# Altium footprint library THU VIEN V1.PcbLib: 400 footprints (part 15 of 25)
Each footprint in its own frame and in the unit in brackets; x right, y up, seen from the top. Pads: shape width x height; smd on the part's side, far side on the other; paste and mask are expansions set on the pad; w line width, h text height; cw(c..) or ccw(c..) is an arc to the next point about the centre after c.
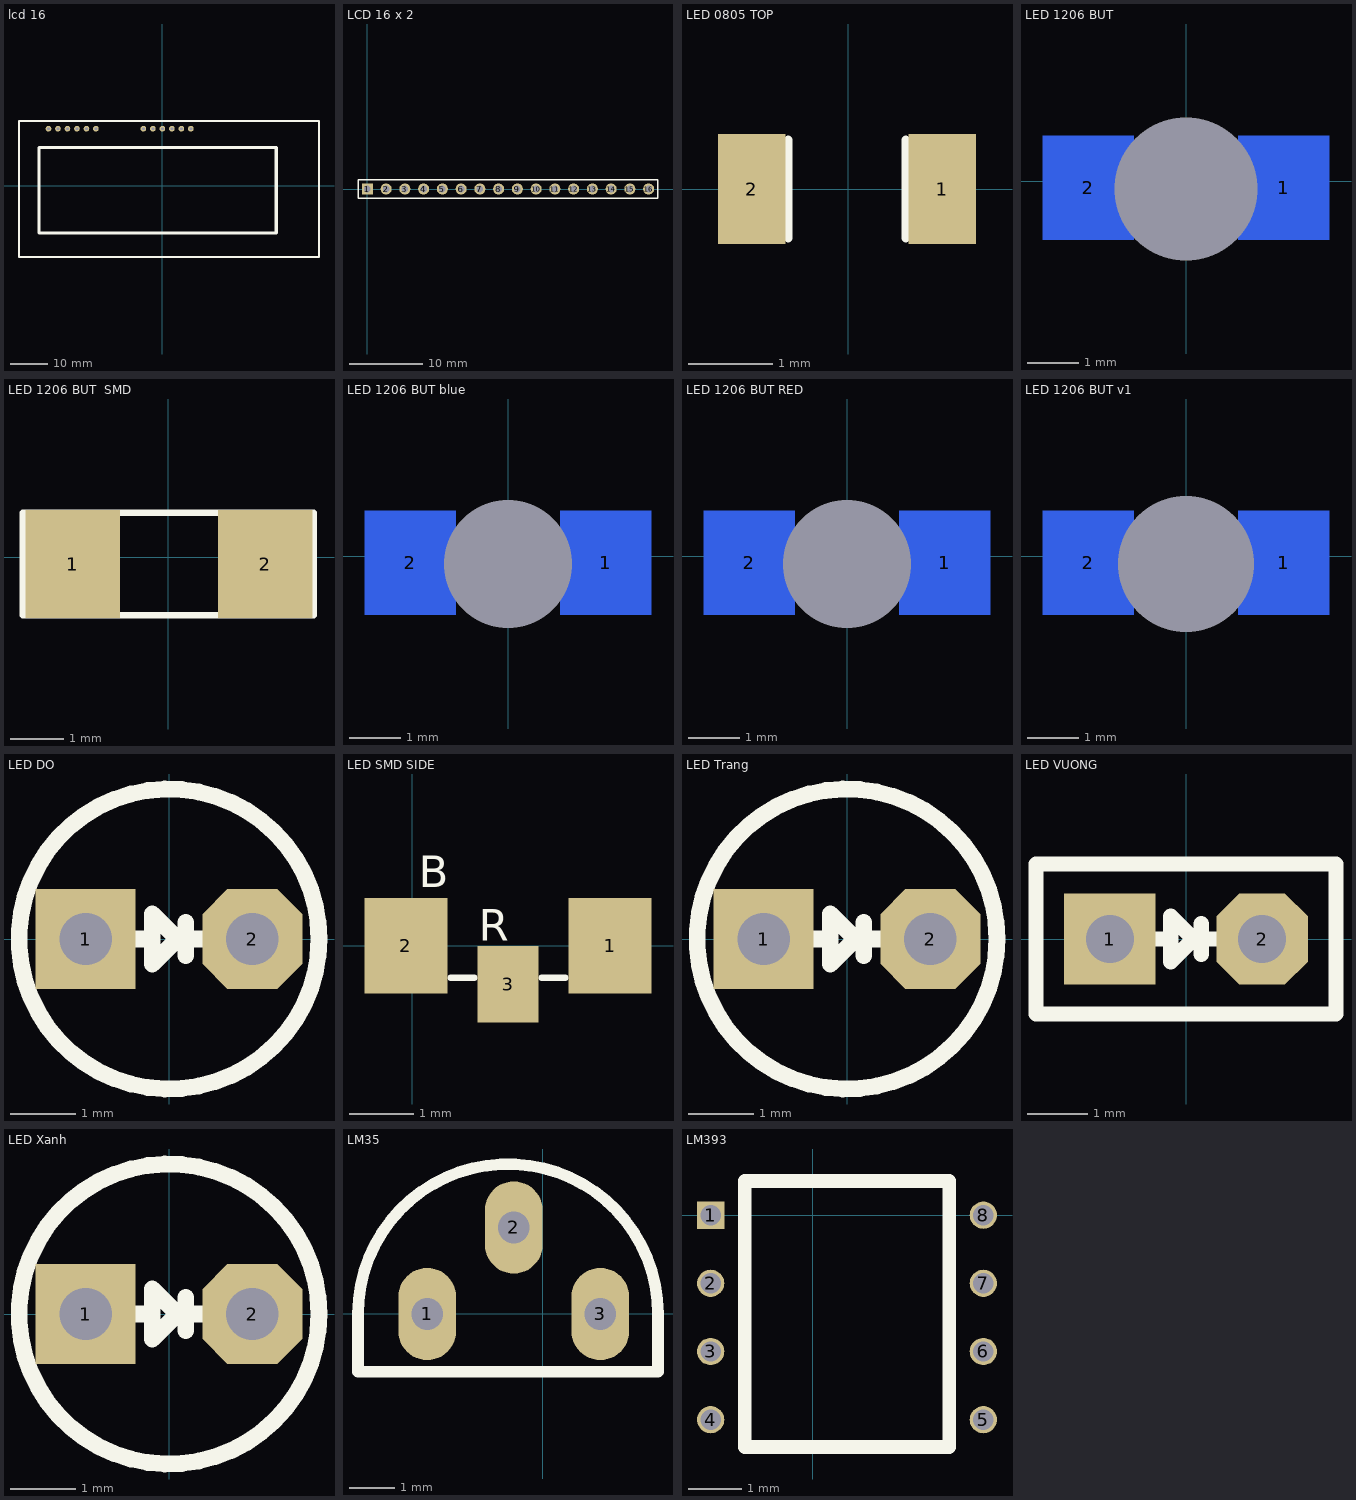
[diagram p14: the footprints below, top view; thin cyan lines are the x and y axes]

## lcd 16 [mil]
pads (12):
  round 60 hole 30: 1(-1200,600) 2(-1100,600) 3(-1000,600) 4(-900,600) 5(-800,600) 6(-700,600) 11(-200,600) 12(-100,600) 13(0,600) 14(100,600) 15(200,600) 16(300,600)
Top Overlay:
  lines w21.26: -1510,-750 -1510,680 1650,680 1650,-750 -1510,-750
  lines w31.5: -1300,400 1200,400
  lines w33.62: -1300,400 -1300,-500 1200,-500 1200,400
3D body: height 754, standoff 234, extent -1511.64,-758.5 1657.65,678.51
3D body: height 435.49, standoff 3.21, extent -1250,550 -1050,650
3D body: height 435.49, standoff 3.21, extent -1050,550 -850,650
3D body: height 435.49, standoff 3.21, extent -850,550 -650,650
3D body: height 435.49, standoff 3.21, extent -650,550 -450,650
3D body: height 435.49, standoff 3.21, extent -450,550 -250,650
3D body: height 435.49, standoff 3.21, extent -250,550 -50,650
3D body: height 435.49, standoff 3.21, extent -50,550 150,650
3D body: height 435.49, standoff 3.21, extent 150,550 350,650
3D body: height 237.01, standoff -122.05, extent -1250,550 -850,650
3D body: height 237.01, standoff -122.05, extent -850,550 -450,650
3D body: height 237.01, standoff -122.05, extent -450,550 -50,650
3D body: height 237.01, standoff -122.05, extent -49.99,550.01 350.01,650.01

## LCD 16 x 2 [mm] "Connector; Header; 16 Position"
pads (16):
  rect 1.5x1.5 hole 0.9: 1(0,0)
  round 1.5 hole 0.9: 2(2.54,0) 3(5.08,0) 4(7.62,0) 5(10.16,0) 6(12.7,0) 7(15.24,0) 8(17.78,0) 9(20.32,0) 10(22.86,0) 11(25.4,0) 12(27.94,0) 13(30.48,0) 14(33.02,0) 15(35.56,0) 16(38.1,0)
Top Overlay:
  lines w0.2: -1.27,-1.27 -1.27,1.27 0.635,1.27 39.37,1.27 39.37,-1.27 -1.27,-1.27
3D body: height 10.52, standoff -2.69, extent -8.093,-34.506 72.407,1.994

## LED 7SEG [mm]

## LED 0805 TOP [mm]
pads (2):
  rect 0.8x1.3 smd: 1(1.118,0) 2(-1.143,0)
Top Overlay:
  lines w0.1: -0.711,-0.584 -0.711,0.584 ; 0.686,-0.584 0.686,0.584
3D body: height 1.1, standoff 0, extent -1.01,-0.625 1.01,0.625

## LED 1206 BUT [mil]
pads (3):
  rect 70x80 smd far side: 1(75,-5) 2(-75,-5)
  round 0 hole 110: ""(0,-6)
Bottom Overlay:
  lines w5: -110,-43 110,-43 110,33 -110,33 -110,-43
3D body: height 8.81, standoff -50.9, extent -64,-36 62,27

## LED 1206 BUT  SMD [mil]
pads (2):
  rect 70x80 smd: 1(-71,-5) 2(72,-5)
Top Overlay:
  lines w5: -108,-43 -108,33 108,33 108,-43 -108,-43
3D body: height 43.81, standoff -15.9, extent -60,-37 66,26

## LED 1206 BUT blue [mil]
pads (3):
  rect 70x80 smd far side: 1(75,-5) 2(-75,-5)
  round 0 hole 98.43: ""(0,-6)
Bottom Overlay:
  lines w5: -110,-43 110,-43 110,33 -110,33 -110,-43
3D body: height 6.31, standoff -37, extent -63.39,-37.5 63.39,25.5

## LED 1206 BUT RED [mil]
pads (3):
  rect 70x80 smd far side: 1(75,-5) 2(-75,-5)
  round 0 hole 98.43: ""(0,-6)
Bottom Overlay:
  lines w5: -110,-43 110,-43 110,33 -110,33 -110,-43
3D body: height 6.31, standoff -37, extent -63.39,-37.5 63.39,25.5

## LED 1206 BUT v1 [mil]
pads (3):
  rect 70x80 smd far side: 1(75,-5) 2(-75,-5)
  round 98.43 hole 104.33: ""(0,-6)
Bottom Overlay:
  lines w5: -110,-43 -110,33 110,33 110,-43 -110,-43
3D body: height 8.81, standoff -50.9, extent -63,-37 63,26

## LED DO [mil]
pads (2):
  rect 60x60 hole 31.5: 1(-50,0)
  oct 60x60 hole 31.5: 2(50,0)
Top Overlay:
  circle w10: c0,0 r90
  lines w10: -20,0 -10,0 ; 10,-10 10,10 ; 10,0 20,0 ; -10,-15 5,0 -10,15 -10,-15
3D body: height 212, standoff -125, extent -78.42,-58.99 78.43,78.51

## LED SMD SIDE [mm]
pads (3):
  rect 1.3x1.5 smd: 1(3.1,0) 2(-0.1,0)
  rect 0.95x1.2 smd: 3(1.5,-0.6)
Top Overlay:
  lines w0.1: 0.6,-0.5 0.975,-0.5 ; 2.025,-0.5 2.4,-0.5
  text "B" at 0.102,0.914 h0.5
  text "R" at 1.041,0.076 h0.5
3D body: height 1, standoff 0, extent 0,-0.45 3,1.55

## LED Trang [mil]
pads (2):
  rect 60x60 hole 31.5: 1(-50,0)
  oct 60x60 hole 31.5: 2(50,0)
Top Overlay:
  circle w10: c0,0 r90
  lines w10: -20,0 -10,0 ; 10,-10 10,10 ; 10,0 20,0 ; -10,-15 -10,15 5,0 -10,-15
3D body: height 255.91, standoff -78.74, extent -74.8,-74.8 63,74.8

## LED VUONG [mil]
pads (2):
  rect 60x60 hole 31.5: 1(-50,0)
  oct 60x60 hole 31.5: 2(50,0)
Top Overlay:
  lines w10: -20,0 -10,0 ; 10,-10 10,10 ; 10,0 20,0 ; -98.43,-49.21 -98.43,49.21 98.43,49.21 98.43,-49.21 -98.43,-49.21 ; -10,-15 -10,15 5,0 -10,-15

## LED Xanh [mil]
pads (2):
  rect 60x60 hole 31.5: 1(-50,0)
  oct 60x60 hole 31.5: 2(50,0)
Top Overlay:
  circle w10: c0,0 r90
  lines w10: -20,0 -10,0 ; 10,-10 10,10 ; 10,0 20,0 ; -10,-15 5,0 -10,15 -10,-15
3D body: height 262, standoff -75, extent -77.42,-58.99 79.43,78.51

## LM35 [mm]
pads (3):
  oval 1.27x2.032 hole 0.7: 1(-2.54,0) 2(-0.635,1.905) 3(1.27,0)
Top Overlay:
  lines w0.254: -4.064,-1.27 -4.064,0 cw(c-0.762,0) 2.54,0 2.54,-1.27 -4.064,-1.27
3D body: height 6.99, standoff -0.71, extent -3.39,-1.1 2.19,2.871

## LM393 [mil] "DIP; 8 Leads; Row Spacing 7.62 mm; Pitch 2.54 mm"
height 200
pads (8):
  rect 20x20 hole 15: 1(-75,0)
  round 20 hole 15: 2(-75,-50) 3(-75,-100) 4(-75,-150) 5(125,-150) 6(125,-100) 7(125,-50) 8(125,0)
Top Overlay:
  lines w10: -50,-170 100,-170 100,25 -50,25 ; -50,-170 -50,25 ; -50,-170 -50,-150 -50,25